# Altium footprint library Amirreza.PcbLib: 524 footprints (part 6 of 33)
Each footprint in its own frame and in the unit in brackets; x right, y up, seen from the top. Pads: shape width x height; smd on the part's side, far side on the other; paste and mask are expansions set on the pad; w line width, h text height; cw(c..) or ccw(c..) is an arc to the next point about the centre after c.
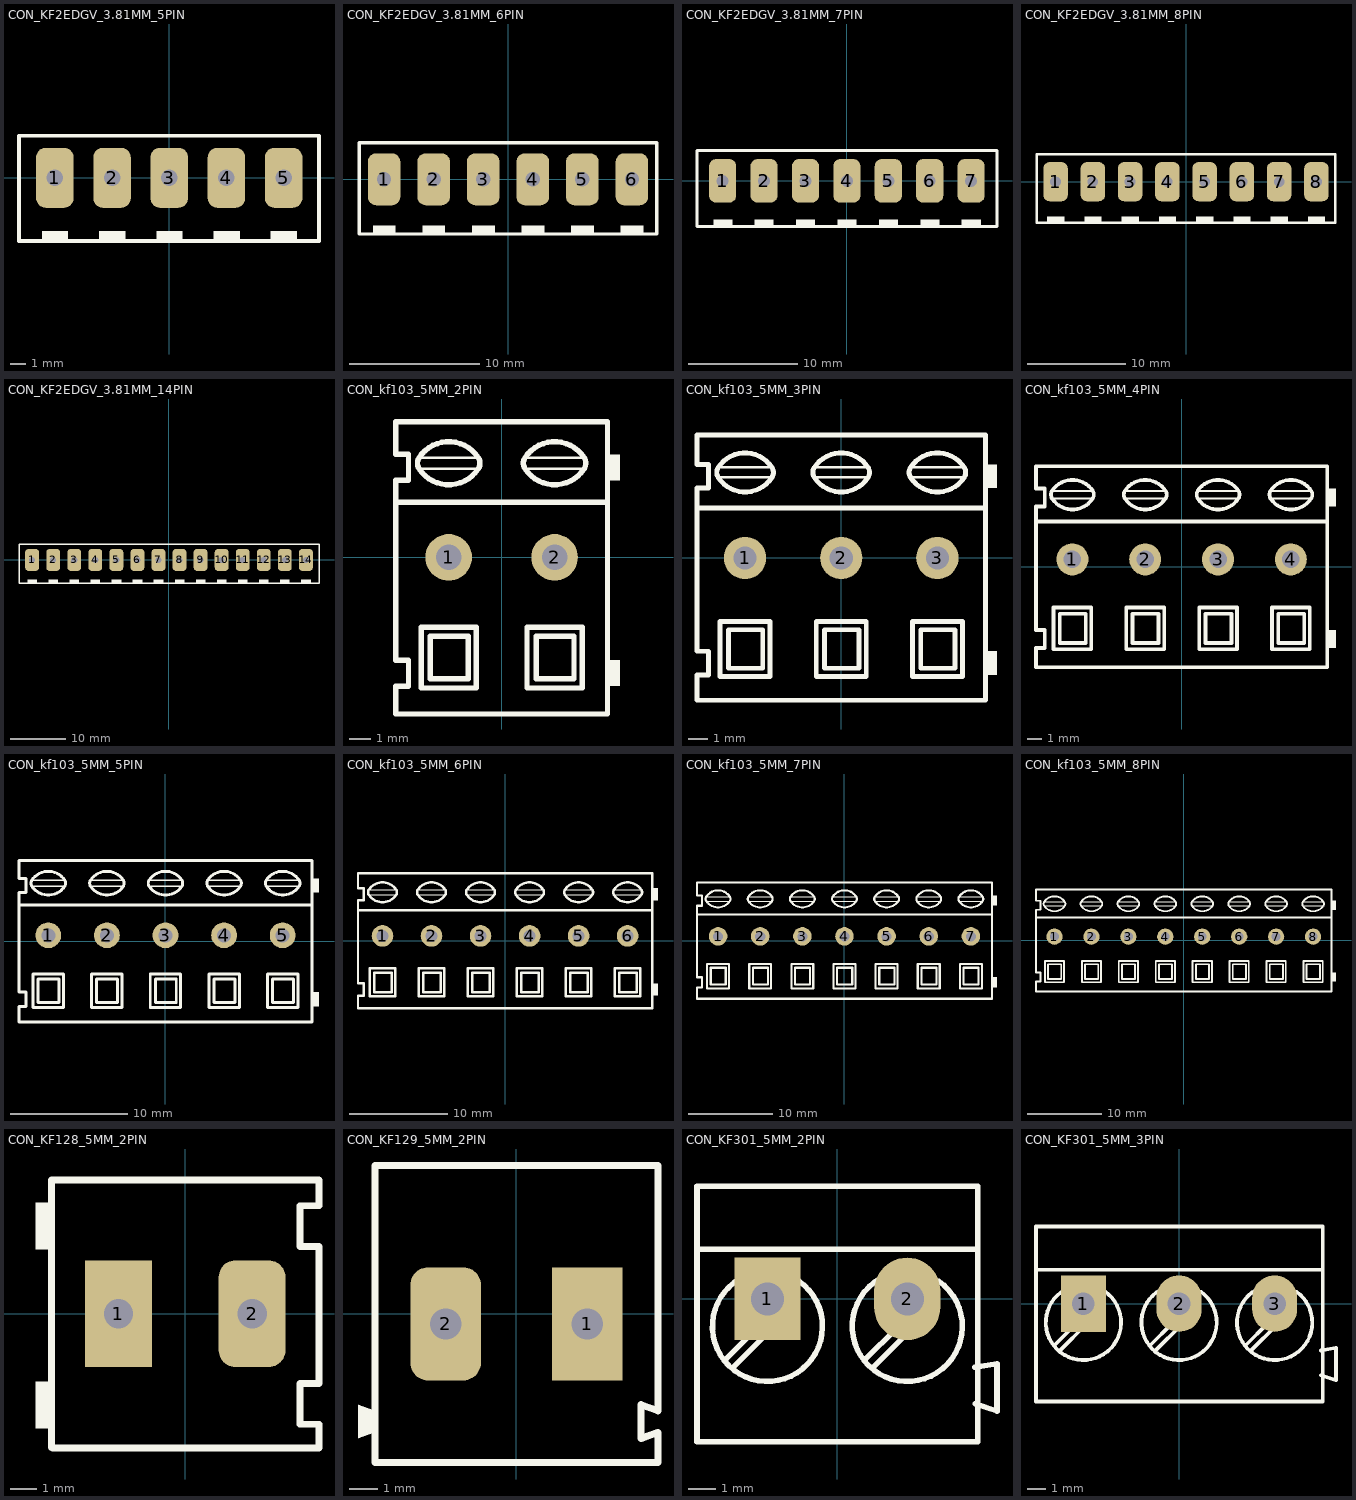
[diagram p5: the footprints below, top view; thin cyan lines are the x and y axes]

## CON_KF2EDGV_3.81MM_5PIN [mm]
pads (5):
  rrect50% 2.5x4 hole 1.1: 1(-7.62,0) 2(-3.81,0) 3(0,0) 4(3.81,0) 5(7.62,0)
Top Overlay:
  rectangle: 6.756,-4.293 8.509,-3.556
  rectangle: 2.946,-4.293 4.699,-3.556
  rectangle: -0.864,-4.293 0.889,-3.556
  rectangle: -4.674,-4.293 -2.921,-3.556
  rectangle: -8.484,-4.293 -6.731,-3.556
  lines w0.254: -10.005,-4.2 -10.005,2.8 9.974,2.8 9.974,-4.2 -10.005,-4.2
3D body "691321300005.stp": height 9.25, standoff -3.45, extent -10.135,-4.387 10.105,2.813
3D body "1827156.stp": height 21.8, standoff 2.7, extent -9.92,-5.955 9.92,4.445

## CON_KF2EDGV_3.81MM_6PIN [mm]
pads (6):
  rrect50% 2.5x4 hole 1.1: 1(-9.525,0) 2(-5.715,0) 3(-1.905,0) 4(1.905,0) 5(5.715,0) 6(9.525,0)
Top Overlay:
  rectangle: -10.389,-4.293 -8.636,-3.556
  rectangle: -6.579,-4.293 -4.826,-3.556
  rectangle: -2.769,-4.293 -1.016,-3.556
  rectangle: 1.041,-4.293 2.794,-3.556
  rectangle: 4.851,-4.293 6.604,-3.556
  rectangle: 8.661,-4.293 10.414,-3.556
  lines w0.254: -11.43,2.8 -11.43,-4.2 11.43,-4.2 11.43,2.8 -11.424,2.8
3D body "691321300003.stp": height 9.25, standoff -3.45, extent -0.595,-4.406 12.025,2.794
3D body "691321300003.stp": height 9.25, standoff -3.45, extent -12.025,-4.406 0.595,2.794

## CON_KF2EDGV_3.81MM_7PIN [mm]
pads (7):
  rrect50% 2.5x4 hole 1.1: 1(-11.43,0) 2(-7.62,0) 3(-3.81,0) 4(0,0) 5(3.81,0) 6(7.62,0) 7(11.43,0)
Top Overlay:
  rectangle: 10.566,-4.293 12.319,-3.556
  rectangle: 6.756,-4.293 8.509,-3.556
  rectangle: 2.946,-4.293 4.699,-3.556
  rectangle: -0.864,-4.293 0.889,-3.556
  rectangle: -4.674,-4.293 -2.921,-3.556
  rectangle: -8.484,-4.293 -6.731,-3.556
  rectangle: -12.294,-4.293 -10.541,-3.556
  lines w0.254: -13.789,-4.2 -13.789,2.8 13.812,2.8 13.812,-4.2 -13.789,-4.2
3D body "691321300007.stp": height 9.25, standoff -3.45, extent -13.919,-4.387 13.941,2.813

## CON_KF2EDGV_3.81MM_8PIN [mm]
pads (8):
  rrect50% 2.5x4 hole 1.1: 1(-13.335,0) 2(-9.525,0) 3(-5.715,0) 4(-1.905,0) 5(1.905,0) 6(5.715,0) 7(9.525,0) 8(13.335,0)
Top Overlay:
  rectangle: 12.471,-4.293 14.224,-3.556
  rectangle: 8.661,-4.293 10.414,-3.556
  rectangle: 4.851,-4.293 6.604,-3.556
  rectangle: 1.041,-4.293 2.794,-3.556
  rectangle: -2.769,-4.293 -1.016,-3.556
  rectangle: -6.579,-4.293 -4.826,-3.556
  rectangle: -10.389,-4.293 -8.636,-3.556
  rectangle: -14.199,-4.293 -12.446,-3.556
  lines w0.254: -15.24,2.8 -15.24,-4.2 15.24,-4.2 15.24,2.8 -15.234,2.8
3D body "1827185.stp": height 21.8, standoff 2.7, extent -15.66,-5.93 15.61,4.47
3D body "691321300004.stp": height 9.25, standoff -3.45, extent -15.835,-4.386 0.595,2.814
3D body "691321300004.stp": height 9.25, standoff -3.45, extent -0.595,-4.386 15.835,2.814

## CON_KF2EDGV_3.81MM_14PIN [mm]
pads (14):
  rrect50% 2.5x4 hole 1.1: 1(-24.765,0) 2(-20.955,0) 3(-17.145,0) 4(-13.335,0) 5(-9.525,0) 6(-5.715,0) 7(-1.905,0) 8(1.905,0) 9(5.715,0) 10(9.525,0) 11(13.335,0) 12(17.145,0) 13(20.955,0) 14(24.765,0)
Top Overlay:
  rectangle: 1.041,-4.293 2.794,-3.556
  rectangle: -2.769,-4.293 -1.016,-3.556
  rectangle: -6.579,-4.293 -4.826,-3.556
  rectangle: -10.389,-4.293 -8.636,-3.556
  rectangle: -14.199,-4.293 -12.446,-3.556
  rectangle: -18.009,-4.293 -16.256,-3.556
  rectangle: -21.819,-4.293 -20.066,-3.556
  rectangle: -25.629,-4.293 -23.876,-3.556
  rectangle: 23.901,-4.293 25.654,-3.556
  rectangle: 20.091,-4.293 21.844,-3.556
  rectangle: 16.281,-4.293 18.034,-3.556
  rectangle: 12.471,-4.293 14.224,-3.556
  rectangle: 8.661,-4.293 10.414,-3.556
  rectangle: 4.851,-4.293 6.604,-3.556
  lines w0.254: -27.136,-4.2 -27.136,2.8 27.137,2.8 27.137,-4.2 -27.136,-4.2
3D body "1827240.stp": height 21.8, standoff 2.7, extent -27.014,-5.98 27.116,4.42
3D body "691321300014.stp": height 9.25, standoff -3.45, extent -27.265,-4.381 27.265,2.819

## CON_kf103_5MM_2PIN [mm]
pads (2):
  round 2.2 / inner round 2.2 / far side rect 2.5x4 hole 1.2: 1(-2.5,0)
  round 2.2 / inner round 2.2 / far side rrect50% 2.5x4 hole 1.2: 2(2.5,0)
Top Overlay:
  rectangle: 5,3.634 5.6,4.866
  rectangle: 5,-6.085 5.6,-4.853
  lines w0.127: -3.897,4.185 -1.103,4.185 ; -3.897,4.705 -1.103,4.705 ; 1.103,4.185 3.897,4.185 ; 1.103,4.705 3.897,4.705
  lines w0.254: -5,2.601 5,2.601 ; -3.367,-3.735 -3.367,-5.737 -1.582,-5.737 ; -3.316,-3.735 -1.582,-3.735 -1.582,-5.686 ; 1.633,-3.735 1.633,-5.737 3.418,-5.737 ; 1.684,-3.735 3.418,-3.735 3.418,-5.686 ; -5,-7.4 5,-7.4 5,6.4 -5,6.4 -5,4.866 -4.4,4.866 -4.4,3.634 -5,3.634 -5,-4.853 -4.4,-4.853 -4.4,-6.085 -5,-6.085 -5,-7.4 ; -3.897,4.185 ccw(c-2.5,5.098) -1.103,4.185 ccw(c-1.51,4.445) -1.103,4.705 ccw(c-2.5,3.792) -3.897,4.705 ccw(c-3.49,4.445) -3.897,4.185 ; -3.8,-6.17 -3.8,-3.302 -1.2,-3.302 -1.2,-6.17 -3.8,-6.17 ; 1.103,4.185 ccw(c2.5,5.098) 3.897,4.185 ccw(c3.49,4.445) 3.897,4.705 ccw(c2.5,3.792) 1.103,4.705 ccw(c1.51,4.445) 1.103,4.185 ; 1.2,-6.17 1.2,-3.302 3.8,-3.302 3.8,-6.17 1.2,-6.17
3D body "DG103-5.0-02.stp": height 15.55, standoff -3.45, extent -5,-7.8 5.55,6

## CON_kf103_5MM_3PIN [mm]
pads (3):
  round 2.2 / inner round 2.2 / far side rect 2.5x4 hole 1.2: 1(-5,0)
  round 2.2 / inner round 2.2 / far side rrect50% 2.5x4 hole 1.2: 2(0,0) 3(5,0)
Top Overlay:
  rectangle: 7.5,3.634 8.1,4.866
  rectangle: 7.5,-6.085 8.1,-4.853
  lines w0.127: -6.397,4.185 -3.603,4.185 ; -6.397,4.705 -3.603,4.705 ; -1.397,4.185 1.397,4.185 ; -1.397,4.705 1.397,4.705 ; 3.603,4.185 6.397,4.185 ; 3.603,4.705 6.397,4.705
  lines w0.254: -7.5,2.601 7.5,2.601 ; -5.867,-3.735 -5.867,-5.737 -4.082,-5.737 ; -5.816,-3.735 -4.082,-3.735 -4.082,-5.686 ; -0.867,-3.735 -0.867,-5.737 0.918,-5.737 ; -0.816,-3.735 0.918,-3.735 0.918,-5.686 ; 4.133,-3.735 4.133,-5.737 5.918,-5.737 ; 4.184,-3.735 5.918,-3.735 5.918,-5.686 ; -7.5,-7.4 7.5,-7.4 7.5,6.4 -7.5,6.4 -7.5,4.866 -6.9,4.866 -6.9,3.634 -7.5,3.634 -7.5,-4.853 -6.9,-4.853 -6.9,-6.085 -7.5,-6.085 -7.5,-7.4 ; -6.397,4.185 ccw(c-5,5.098) -3.603,4.185 ccw(c-4.01,4.445) -3.603,4.705 ccw(c-5,3.792) -6.397,4.705 ccw(c-5.99,4.445) -6.397,4.185 ; -6.3,-6.17 -6.3,-3.302 -3.7,-3.302 -3.7,-6.17 -6.3,-6.17 ; -1.397,4.185 ccw(c0,5.098) 1.397,4.185 ccw(c0.99,4.445) 1.397,4.705 ccw(c0,3.792) -1.397,4.705 ccw(c-0.99,4.445) -1.397,4.185 ; -1.3,-6.17 -1.3,-3.302 1.3,-3.302 1.3,-6.17 -1.3,-6.17 ; 3.603,4.185 ccw(c5,5.098) 6.397,4.185 ccw(c5.99,4.445) 6.397,4.705 ccw(c5,3.792) 3.603,4.705 ccw(c4.01,4.445) 3.603,4.185 ; 3.7,-6.17 3.7,-3.302 6.3,-3.302 6.3,-6.17 3.7,-6.17
3D body "DG103-5.0-03.stp": height 15.55, standoff -3.45, extent -7.498,-7.789 8.052,6.011

## CON_kf103_5MM_4PIN [mm]
pads (4):
  round 2.2 / inner round 2.2 / far side rect 2.5x4 hole 1.2: 1(-7.5,0.5)
  round 2.2 / inner round 2.2 / far side rrect50% 2.5x4 hole 1.2: 2(-2.5,0.5) 3(2.5,0.5) 4(7.5,0.5)
Top Overlay:
  rectangle: 10,-5.585 10.6,-4.353
  rectangle: 10,4.134 10.6,5.366
  lines w0.127: -8.897,4.685 -6.103,4.685 ; -8.897,5.205 -6.103,5.205 ; -3.897,4.685 -1.103,4.685 ; -3.897,5.205 -1.103,5.205 ; 1.103,4.685 3.897,4.685 ; 1.103,5.205 3.897,5.205 ; 6.103,4.685 8.897,4.685 ; 6.103,5.205 8.897,5.205
  lines w0.254: -10,3.101 10,3.101 ; -8.367,-3.235 -8.367,-5.237 -6.582,-5.237 ; -8.316,-3.235 -6.582,-3.235 -6.582,-5.186 ; -3.367,-3.235 -3.367,-5.237 -1.582,-5.237 ; -3.316,-3.235 -1.582,-3.235 -1.582,-5.186 ; 1.633,-3.235 1.633,-5.237 3.418,-5.237 ; 1.684,-3.235 3.418,-3.235 3.418,-5.186 ; 6.633,-3.235 6.633,-5.237 8.418,-5.237 ; 6.684,-3.235 8.418,-3.235 8.418,-5.186 ; -10,-6.9 -10,-5.585 -9.4,-5.585 -9.4,-4.353 -10,-4.353 -10,4.134 -9.4,4.134 -9.4,5.366 -10,5.366 -10,6.9 10,6.9 10,-6.9 -10,-6.9 ; -8.897,4.685 cw(c-8.49,4.945) -8.897,5.205 cw(c-7.5,4.292) -6.103,5.205 cw(c-6.51,4.945) -6.103,4.685 cw(c-7.5,5.598) -8.897,4.685 ; -8.8,-5.67 -6.2,-5.67 -6.2,-2.802 -8.8,-2.802 -8.8,-5.67 ; -3.897,4.685 cw(c-3.49,4.945) -3.897,5.205 cw(c-2.5,4.292) -1.103,5.205 cw(c-1.51,4.945) -1.103,4.685 cw(c-2.5,5.598) -3.897,4.685 ; -3.8,-5.67 -1.2,-5.67 -1.2,-2.802 -3.8,-2.802 -3.8,-5.67 ; 1.103,4.685 cw(c1.51,4.945) 1.103,5.205 cw(c2.5,4.292) 3.897,5.205 cw(c3.49,4.945) 3.897,4.685 cw(c2.5,5.598) 1.103,4.685 ; 1.2,-5.67 3.8,-5.67 3.8,-2.802 1.2,-2.802 1.2,-5.67 ; 6.103,4.685 cw(c6.51,4.945) 6.103,5.205 cw(c7.5,4.292) 8.897,5.205 cw(c8.49,4.945) 8.897,4.685 cw(c7.5,5.598) 6.103,4.685 ; 6.2,-5.67 8.8,-5.67 8.8,-2.802 6.2,-2.802 6.2,-5.67
3D body "DG103-5.0-02.stp": height 15.55, standoff -3.45, extent 0,-7.3 10.55,6.5
3D body "DG103-5.0-02.stp": height 15.55, standoff -3.45, extent -10,-7.3 0.55,6.5

## CON_kf103_5MM_5PIN [mm]
pads (5):
  round 2.2 / inner round 2.2 / far side rect 2.5x4 hole 1.2: 1(-10,0.5)
  round 2.2 / inner round 2.2 / far side rrect50% 2.5x4 hole 1.2: 2(-5,0.5) 3(0,0.5) 4(5,0.5) 5(10,0.5)
Top Overlay:
  rectangle: 12.5,-5.585 13.1,-4.353
  rectangle: 12.5,4.134 13.1,5.366
  lines w0.127: -11.397,4.685 -8.603,4.685 ; -11.397,5.205 -8.603,5.205 ; -6.397,4.685 -3.603,4.685 ; -6.397,5.205 -3.603,5.205 ; -1.397,4.685 1.397,4.685 ; -1.397,5.205 1.397,5.205 ; 3.603,4.685 6.397,4.685 ; 3.603,5.205 6.397,5.205 ; 8.603,4.685 11.397,4.685 ; 8.603,5.205 11.397,5.205
  lines w0.254: -12.5,3.101 12.5,3.101 ; -10.867,-3.235 -10.867,-5.237 -9.082,-5.237 ; -10.816,-3.235 -9.082,-3.235 -9.082,-5.186 ; -5.867,-3.235 -5.867,-5.237 -4.082,-5.237 ; -5.816,-3.235 -4.082,-3.235 -4.082,-5.186 ; -0.867,-3.235 -0.867,-5.237 0.918,-5.237 ; -0.816,-3.235 0.918,-3.235 0.918,-5.186 ; 4.133,-3.235 4.133,-5.237 5.918,-5.237 ; 4.184,-3.235 5.918,-3.235 5.918,-5.186 ; 9.133,-3.235 9.133,-5.237 10.918,-5.237 ; 9.184,-3.235 10.918,-3.235 10.918,-5.186 ; -12.5,-6.9 -12.5,-5.585 -11.9,-5.585 -11.9,-4.353 -12.5,-4.353 -12.5,4.134 -11.9,4.134 -11.9,5.366 -12.5,5.366 -12.5,6.9 12.5,6.9 12.5,-6.9 -12.5,-6.9 ; -11.397,4.685 cw(c-10.99,4.945) -11.397,5.205 cw(c-10,4.292) -8.603,5.205 cw(c-9.01,4.945) -8.603,4.685 cw(c-10,5.598) -11.397,4.685 ; -11.3,-5.67 -8.7,-5.67 -8.7,-2.802 -11.3,-2.802 -11.3,-5.67 ; -6.397,4.685 cw(c-5.99,4.945) -6.397,5.205 cw(c-5,4.292) -3.603,5.205 cw(c-4.01,4.945) -3.603,4.685 cw(c-5,5.598) -6.397,4.685 ; -6.3,-5.67 -3.7,-5.67 -3.7,-2.802 -6.3,-2.802 -6.3,-5.67 ; -1.397,4.685 cw(c-0.99,4.945) -1.397,5.205 cw(c0,4.292) 1.397,5.205 cw(c0.99,4.945) 1.397,4.685 cw(c0,5.598) -1.397,4.685 ; -1.3,-5.67 1.3,-5.67 1.3,-2.802 -1.3,-2.802 -1.3,-5.67 ; 3.603,4.685 cw(c4.01,4.945) 3.603,5.205 cw(c5,4.292) 6.397,5.205 cw(c5.99,4.945) 6.397,4.685 cw(c5,5.598) 3.603,4.685 ; 3.7,-5.67 6.3,-5.67 6.3,-2.802 3.7,-2.802 3.7,-5.67 ; 8.603,4.685 cw(c9.01,4.945) 8.603,5.205 cw(c10,4.292) 11.397,5.205 cw(c10.99,4.945) 11.397,4.685 cw(c10,5.598) 8.603,4.685 ; 8.7,-5.67 11.3,-5.67 11.3,-2.802 8.7,-2.802 8.7,-5.67
3D body "DG103-5.0-02.stp": height 15.55, standoff -3.45, extent -12.5,-7.3 -1.95,6.5
3D body "DG103-5.0-03.stp": height 15.55, standoff -3.45, extent -2.498,-7.289 13.052,6.511

## CON_kf103_5MM_6PIN [mm]
pads (6):
  round 2.2 / inner round 2.2 / far side rect 2.5x4 hole 1.2: 1(-12.5,0.5)
  round 2.2 / inner round 2.2 / far side rrect50% 2.5x4 hole 1.2: 2(-7.5,0.5) 3(-2.5,0.5) 4(2.5,0.5) 5(7.5,0.5) 6(12.5,0.5)
Top Overlay:
  rectangle: 15,-5.585 15.6,-4.353
  rectangle: 15,4.134 15.6,5.366
  lines w0.127: -13.897,4.685 -11.103,4.685 ; -13.897,5.205 -11.103,5.205 ; -8.897,4.685 -6.103,4.685 ; -8.897,5.205 -6.103,5.205 ; -3.897,4.685 -1.103,4.685 ; -3.897,5.205 -1.103,5.205 ; 1.103,4.685 3.897,4.685 ; 1.103,5.205 3.897,5.205 ; 6.103,4.685 8.897,4.685 ; 6.103,5.205 8.897,5.205 ; 11.103,4.685 13.897,4.685 ; 11.103,5.205 13.897,5.205
  lines w0.254: -15,3.101 15,3.101 ; -13.367,-3.235 -13.367,-5.237 -11.582,-5.237 ; -13.316,-3.235 -11.582,-3.235 -11.582,-5.186 ; -8.367,-3.235 -8.367,-5.237 -6.582,-5.237 ; -8.316,-3.235 -6.582,-3.235 -6.582,-5.186 ; -3.367,-3.235 -3.367,-5.237 -1.582,-5.237 ; -3.316,-3.235 -1.582,-3.235 -1.582,-5.186 ; 1.633,-3.235 1.633,-5.237 3.418,-5.237 ; 1.684,-3.235 3.418,-3.235 3.418,-5.186 ; 6.633,-3.235 6.633,-5.237 8.418,-5.237 ; 6.684,-3.235 8.418,-3.235 8.418,-5.186 ; 11.633,-3.235 11.633,-5.237 13.418,-5.237 ; 11.684,-3.235 13.418,-3.235 13.418,-5.186 ; -15,-6.9 -15,-5.585 -14.4,-5.585 -14.4,-4.353 -15,-4.353 -15,4.134 -14.4,4.134 -14.4,5.366 -15,5.366 -15,6.9 15,6.9 15,-6.9 -15,-6.9 ; -13.897,4.685 cw(c-13.49,4.945) -13.897,5.205 cw(c-12.5,4.292) -11.103,5.205 cw(c-11.51,4.945) -11.103,4.685 cw(c-12.5,5.598) -13.897,4.685 ; -13.8,-5.67 -11.2,-5.67 -11.2,-2.802 -13.8,-2.802 -13.8,-5.67 ; -8.897,4.685 cw(c-8.49,4.945) -8.897,5.205 cw(c-7.5,4.292) -6.103,5.205 cw(c-6.51,4.945) -6.103,4.685 cw(c-7.5,5.598) -8.897,4.685 ; -8.8,-5.67 -6.2,-5.67 -6.2,-2.802 -8.8,-2.802 -8.8,-5.67 ; -3.897,4.685 cw(c-3.49,4.945) -3.897,5.205 cw(c-2.5,4.292) -1.103,5.205 cw(c-1.51,4.945) -1.103,4.685 cw(c-2.5,5.598) -3.897,4.685 ; -3.8,-5.67 -1.2,-5.67 -1.2,-2.802 -3.8,-2.802 -3.8,-5.67 ; 1.103,4.685 cw(c1.51,4.945) 1.103,5.205 cw(c2.5,4.292) 3.897,5.205 cw(c3.49,4.945) 3.897,4.685 cw(c2.5,5.598) 1.103,4.685 ; 1.2,-5.67 3.8,-5.67 3.8,-2.802 1.2,-2.802 1.2,-5.67 ; 6.103,4.685 cw(c6.51,4.945) 6.103,5.205 cw(c7.5,4.292) 8.897,5.205 cw(c8.49,4.945) 8.897,4.685 cw(c7.5,5.598) 6.103,4.685 ; 6.2,-5.67 8.8,-5.67 8.8,-2.802 6.2,-2.802 6.2,-5.67 ; 11.103,4.685 cw(c11.51,4.945) 11.103,5.205 cw(c12.5,4.292) 13.897,5.205 cw(c13.49,4.945) 13.897,4.685 cw(c12.5,5.598) 11.103,4.685 ; 11.2,-5.67 13.8,-5.67 13.8,-2.802 11.2,-2.802 11.2,-5.67
3D body "DG103-5.0-02.stp": height 15.55, standoff -3.45, extent 5,-7.3 15.55,6.5
3D body "DG103-5.0-02.stp": height 15.55, standoff -3.45, extent -5,-7.3 5.55,6.5
3D body "DG103-5.0-02.stp": height 15.55, standoff -3.45, extent -15,-7.3 -4.45,6.5

## CON_kf103_5MM_7PIN [mm]
pads (7):
  round 2.2 / inner round 2.2 / far side rect 2.5x4 hole 1.2: 1(-15,0.5)
  round 2.2 / inner round 2.2 / far side rrect50% 2.5x4 hole 1.2: 2(-10,0.5) 3(-5,0.5) 4(0,0.5) 5(5,0.5) 6(10,0.5) 7(15,0.5)
Top Overlay:
  rectangle: 17.5,-5.585 18.1,-4.353
  rectangle: 17.5,4.134 18.1,5.366
  lines w0.127: -16.397,4.685 -13.603,4.685 ; -16.397,5.205 -13.603,5.205 ; -11.397,4.685 -8.603,4.685 ; -11.397,5.205 -8.603,5.205 ; -6.397,4.685 -3.603,4.685 ; -6.397,5.205 -3.603,5.205 ; -1.397,4.685 1.397,4.685 ; -1.397,5.205 1.397,5.205 ; 3.603,4.685 6.397,4.685 ; 3.603,5.205 6.397,5.205 ; 8.603,4.685 11.397,4.685 ; 8.603,5.205 11.397,5.205 ; 13.603,4.685 16.397,4.685 ; 13.603,5.205 16.397,5.205
  lines w0.254: -17.5,3.101 17.5,3.101 ; -15.867,-3.235 -15.867,-5.237 -14.082,-5.237 ; -15.816,-3.235 -14.082,-3.235 -14.082,-5.186 ; -10.867,-3.235 -10.867,-5.237 -9.082,-5.237 ; -10.816,-3.235 -9.082,-3.235 -9.082,-5.186 ; -5.867,-3.235 -5.867,-5.237 -4.082,-5.237 ; -5.816,-3.235 -4.082,-3.235 -4.082,-5.186 ; -0.867,-3.235 -0.867,-5.237 0.918,-5.237 ; -0.816,-3.235 0.918,-3.235 0.918,-5.186 ; 4.133,-3.235 4.133,-5.237 5.918,-5.237 ; 4.184,-3.235 5.918,-3.235 5.918,-5.186 ; 9.133,-3.235 9.133,-5.237 10.918,-5.237 ; 9.184,-3.235 10.918,-3.235 10.918,-5.186 ; 14.133,-3.235 14.133,-5.237 15.918,-5.237 ; 14.184,-3.235 15.918,-3.235 15.918,-5.186 ; -17.5,-6.9 -17.5,-5.585 -16.9,-5.585 -16.9,-4.353 -17.5,-4.353 -17.5,4.134 -16.9,4.134 -16.9,5.366 -17.5,5.366 -17.5,6.9 17.5,6.9 17.5,-6.9 -17.5,-6.9 ; -16.397,4.685 cw(c-15.99,4.945) -16.397,5.205 cw(c-15,4.292) -13.603,5.205 cw(c-14.01,4.945) -13.603,4.685 cw(c-15,5.598) -16.397,4.685 ; -16.3,-5.67 -13.7,-5.67 -13.7,-2.802 -16.3,-2.802 -16.3,-5.67 ; -11.397,4.685 cw(c-10.99,4.945) -11.397,5.205 cw(c-10,4.292) -8.603,5.205 cw(c-9.01,4.945) -8.603,4.685 cw(c-10,5.598) -11.397,4.685 ; -11.3,-5.67 -8.7,-5.67 -8.7,-2.802 -11.3,-2.802 -11.3,-5.67 ; -6.397,4.685 cw(c-5.99,4.945) -6.397,5.205 cw(c-5,4.292) -3.603,5.205 cw(c-4.01,4.945) -3.603,4.685 cw(c-5,5.598) -6.397,4.685 ; -6.3,-5.67 -3.7,-5.67 -3.7,-2.802 -6.3,-2.802 -6.3,-5.67 ; -1.397,4.685 cw(c-0.99,4.945) -1.397,5.205 cw(c0,4.292) 1.397,5.205 cw(c0.99,4.945) 1.397,4.685 cw(c0,5.598) -1.397,4.685 ; -1.3,-5.67 1.3,-5.67 1.3,-2.802 -1.3,-2.802 -1.3,-5.67 ; 3.603,4.685 cw(c4.01,4.945) 3.603,5.205 cw(c5,4.292) 6.397,5.205 cw(c5.99,4.945) 6.397,4.685 cw(c5,5.598) 3.603,4.685 ; 3.7,-5.67 6.3,-5.67 6.3,-2.802 3.7,-2.802 3.7,-5.67 ; 8.603,4.685 cw(c9.01,4.945) 8.603,5.205 cw(c10,4.292) 11.397,5.205 cw(c10.99,4.945) 11.397,4.685 cw(c10,5.598) 8.603,4.685 ; 8.7,-5.67 11.3,-5.67 11.3,-2.802 8.7,-2.802 8.7,-5.67 ; 13.603,4.685 cw(c14.01,4.945) 13.603,5.205 cw(c15,4.292) 16.397,5.205 cw(c15.99,4.945) 16.397,4.685 cw(c15,5.598) 13.603,4.685 ; 13.7,-5.67 16.3,-5.67 16.3,-2.802 13.7,-2.802 13.7,-5.67
3D body "DG103-5.0-03.stp": height 15.55, standoff -3.45, extent 2.502,-7.289 18.052,6.511
3D body "DG103-5.0-02.stp": height 15.55, standoff -3.45, extent -7.5,-7.3 3.05,6.5
3D body "DG103-5.0-02.stp": height 15.55, standoff -3.45, extent -17.5,-7.3 -6.95,6.5

## CON_kf103_5MM_8PIN [mm]
pads (8):
  round 2.2 / inner round 2.2 / far side rect 2.5x4 hole 1.2: 1(-17.5,0.5)
  round 2.2 / inner round 2.2 / far side rrect50% 2.5x4 hole 1.2: 2(-12.5,0.5) 3(-7.5,0.5) 4(-2.5,0.5) 5(2.5,0.5) 6(7.5,0.5) 7(12.5,0.5) 8(17.5,0.5)
Top Overlay:
  rectangle: 20,4.134 20.6,5.366
  rectangle: 20,-5.585 20.6,-4.353
  lines w0.127: -18.897,4.685 -16.103,4.685 ; -18.897,5.205 -16.103,5.205 ; -13.897,4.685 -11.103,4.685 ; -13.897,5.205 -11.103,5.205 ; -8.897,4.685 -6.103,4.685 ; -8.897,5.205 -6.103,5.205 ; -3.897,4.685 -1.103,4.685 ; -3.897,5.205 -1.103,5.205 ; 1.103,4.685 3.897,4.685 ; 1.103,5.205 3.897,5.205 ; 6.103,4.685 8.897,4.685 ; 6.103,5.205 8.897,5.205 ; 11.103,4.685 13.897,4.685 ; 11.103,5.205 13.897,5.205 ; 16.103,4.685 18.897,4.685 ; 16.103,5.205 18.897,5.205
  lines w0.254: -20,3.101 20,3.101 ; -18.367,-3.235 -18.367,-5.237 -16.582,-5.237 ; -18.316,-3.235 -16.582,-3.235 -16.582,-5.186 ; -13.367,-3.235 -13.367,-5.237 -11.582,-5.237 ; -13.316,-3.235 -11.582,-3.235 -11.582,-5.186 ; -8.367,-3.235 -8.367,-5.237 -6.582,-5.237 ; -8.316,-3.235 -6.582,-3.235 -6.582,-5.186 ; -3.367,-3.235 -3.367,-5.237 -1.582,-5.237 ; -3.316,-3.235 -1.582,-3.235 -1.582,-5.186 ; 1.633,-3.235 1.633,-5.237 3.418,-5.237 ; 1.684,-3.235 3.418,-3.235 3.418,-5.186 ; 6.633,-3.235 6.633,-5.237 8.418,-5.237 ; 6.684,-3.235 8.418,-3.235 8.418,-5.186 ; 11.633,-3.235 11.633,-5.237 13.418,-5.237 ; 11.684,-3.235 13.418,-3.235 13.418,-5.186 ; 16.633,-3.235 16.633,-5.237 18.418,-5.237 ; 16.684,-3.235 18.418,-3.235 18.418,-5.186 ; -20,-6.9 20,-6.9 20,6.9 -20,6.9 -20,5.366 -19.4,5.366 -19.4,4.134 -20,4.134 -20,-4.353 -19.4,-4.353 -19.4,-5.585 -20,-5.585 -20,-6.9 ; -18.897,4.685 ccw(c-17.5,5.598) -16.103,4.685 ccw(c-16.51,4.945) -16.103,5.205 ccw(c-17.5,4.292) -18.897,5.205 ccw(c-18.49,4.945) -18.897,4.685 ; -18.8,-5.67 -18.8,-2.802 -16.2,-2.802 -16.2,-5.67 -18.8,-5.67 ; -13.897,4.685 ccw(c-12.5,5.598) -11.103,4.685 ccw(c-11.51,4.945) -11.103,5.205 ccw(c-12.5,4.292) -13.897,5.205 ccw(c-13.49,4.945) -13.897,4.685 ; -13.8,-5.67 -13.8,-2.802 -11.2,-2.802 -11.2,-5.67 -13.8,-5.67 ; -8.897,4.685 ccw(c-7.5,5.598) -6.103,4.685 ccw(c-6.51,4.945) -6.103,5.205 ccw(c-7.5,4.292) -8.897,5.205 ccw(c-8.49,4.945) -8.897,4.685 ; -8.8,-5.67 -8.8,-2.802 -6.2,-2.802 -6.2,-5.67 -8.8,-5.67 ; -3.897,4.685 ccw(c-2.5,5.598) -1.103,4.685 ccw(c-1.51,4.945) -1.103,5.205 ccw(c-2.5,4.292) -3.897,5.205 ccw(c-3.49,4.945) -3.897,4.685 ; -3.8,-5.67 -3.8,-2.802 -1.2,-2.802 -1.2,-5.67 -3.8,-5.67 ; 1.103,4.685 ccw(c2.5,5.598) 3.897,4.685 ccw(c3.49,4.945) 3.897,5.205 ccw(c2.5,4.292) 1.103,5.205 ccw(c1.51,4.945) 1.103,4.685 ; 1.2,-5.67 1.2,-2.802 3.8,-2.802 3.8,-5.67 1.2,-5.67 ; 6.103,4.685 ccw(c7.5,5.598) 8.897,4.685 ccw(c8.49,4.945) 8.897,5.205 ccw(c7.5,4.292) 6.103,5.205 ccw(c6.51,4.945) 6.103,4.685 ; 6.2,-5.67 6.2,-2.802 8.8,-2.802 8.8,-5.67 6.2,-5.67 ; 11.103,4.685 ccw(c12.5,5.598) 13.897,4.685 ccw(c13.49,4.945) 13.897,5.205 ccw(c12.5,4.292) 11.103,5.205 ccw(c11.51,4.945) 11.103,4.685 ; 11.2,-5.67 11.2,-2.802 13.8,-2.802 13.8,-5.67 11.2,-5.67 ; 16.103,4.685 ccw(c17.5,5.598) 18.897,4.685 ccw(c18.49,4.945) 18.897,5.205 ccw(c17.5,4.292) 16.103,5.205 ccw(c16.51,4.945) 16.103,4.685 ; 16.2,-5.67 16.2,-2.802 18.8,-2.802 18.8,-5.67 16.2,-5.67
3D body "DG103-5.0-02.stp": height 15.55, standoff -3.45, extent -20,-7.3 -9.45,6.5
3D body "DG103-5.0-02.stp": height 15.55, standoff -3.45, extent -10,-7.3 0.55,6.5
3D body "DG103-5.0-02.stp": height 15.55, standoff -3.45, extent 0,-7.3 10.55,6.5
3D body "DG103-5.0-02.stp": height 15.55, standoff -3.45, extent 10,-7.3 20.55,6.5

## CON_KF128_5MM_2PIN [mm]
pads (2):
  rect 2.5x4 hole 1.1: 1(-2.5,0)
  rrect50% 2.5x4 hole 1.1: 2(2.5,0)
Top Overlay:
  region: -5.03,2.409 -5.03,4.162 -5.613,4.162 -5.613,2.409
  region: -5.081,-4.296 -5.081,-2.544 -5.613,-2.544 -5.613,-4.296
  lines w0.254: -5.004,-5.004 -5.004,5.004 ; -4.962,-5.027 5.004,-5.027 ; -4.962,5.006 4.928,5.006 ; 4.293,-4.14 4.293,-2.616 ; 4.293,2.515 4.293,4.039 ; 4.318,-4.14 4.978,-4.14 ; 4.318,2.515 4.978,2.515 ; 4.343,-2.616 4.978,-2.616 ; 4.343,4.039 4.978,4.039 ; 5.004,-5.004 5.004,-4.14 ; 5.004,-2.616 5.004,2.515 ; 5.004,4.039 5.004,5.004
3D body "User Library-TER-KF128-2P.sldprt": height 14.45, standoff -4.85, extent -5.634,-5.268 5.126,5.232

## CON_KF129_5MM_2PIN [mm]
pads (2):
  rect 2.5x4 hole 1.1: 1(2.511,-0.361)
  rrect50% 2.5x4 hole 1.1: 2(-2.489,-0.361)
Top Overlay:
  region: -4.989,-4.192 -4.989,-3.809 -5.587,-3.809 -5.587,-4.405
  region: -4.989,-3.427 -4.989,-3.809 -5.587,-3.809 -5.587,-3.214
  lines w0.254: -4.989,-5.261 -4.989,5.239 5.011,5.239 5.011,-3.427 4.413,-3.214 4.413,-4.405 5.011,-4.192 5.011,-5.261 -4.989,-5.261
3D body "KF129.SLDPRT": height 18.05, standoff -4.15, extent -4.984,-5.211 5.616,5.289

## CON_KF301_5MM_2PIN [mm] "Terminal Block Blue"
pads (2):
  rect 2.4x3 hole 1.2: 1(-2.54,0)
  oval 2.4x3 hole 1.2: 2(2.54,0)
Top Overlay:
  lines w0.2: -5.1,1.8 5.1,1.8 ; -4.071,-2.209 -2.921,-1.059 ; -3.789,-2.491 -2.389,-1.091 ; -3.54,0.732 ccw(c-2.54,-1) -1.393,0.638 ; 1.009,-2.209 2.159,-1.059 ; 1.291,-2.491 2.691,-1.091 ; 1.54,0.732 ccw(c2.54,-1) 3.687,0.638 ; 4.995,-2.484 5.8,-2.35 5.8,-4.075 5.004,-3.81 ; -5.1,-5.2 5.1,-5.2 5.1,4.1 -5.1,4.1 -5.1,-5.2
3D body "Socket Blue_2Pin.STEP": height 12.52, standoff -6.68, extent -4.965,-5.08 5.777,3.988

## CON_KF301_5MM_3PIN [mm] "Terminal Block Blue"
pads (3):
  rect 2.4x3 hole 1.2: 1(-5.08,0)
  oval 2.4x3 hole 1.2: 2(0,0) 3(5.08,0)
Top Overlay:
  lines w0.2: -7.6,1.8 7.64,1.8 ; -6.611,-2.209 -5.461,-1.059 ; -6.329,-2.491 -4.929,-1.091 ; -6.08,0.732 ccw(c-5.08,-1) -3.933,0.638 ; -1.531,-2.209 -0.381,-1.059 ; -1.249,-2.491 0.151,-1.091 ; -1,0.732 ccw(c0,-1) 1.147,0.638 ; 3.549,-2.209 4.699,-1.059 ; 3.831,-2.491 5.231,-1.091 ; 4.08,0.732 ccw(c5.08,-1) 6.227,0.638 ; 7.535,-2.484 8.34,-2.35 8.34,-4.075 7.544,-3.81 ; -7.6,-5.2 7.64,-5.2 7.64,4.1 -7.6,4.1 -7.6,-5.2
3D body "Socket Blue_3Pin.STEP": height 12.78, standoff -6.43, extent -7.494,-5.069 8.328,3.999